# Altium footprint library WR-TBL_Pluggable PCB Header_5.08mm.PcbLib: 295 footprints (part 19 of 19)
Each footprint in its own frame and in the unit in brackets; x right, y up, seen from the top. Pads: shape width x height; smd on the part's side, far side on the other; paste and mask are expansions set on the pad; w line width, h text height; cw(c..) or ccw(c..) is an arc to the next point about the centre after c.
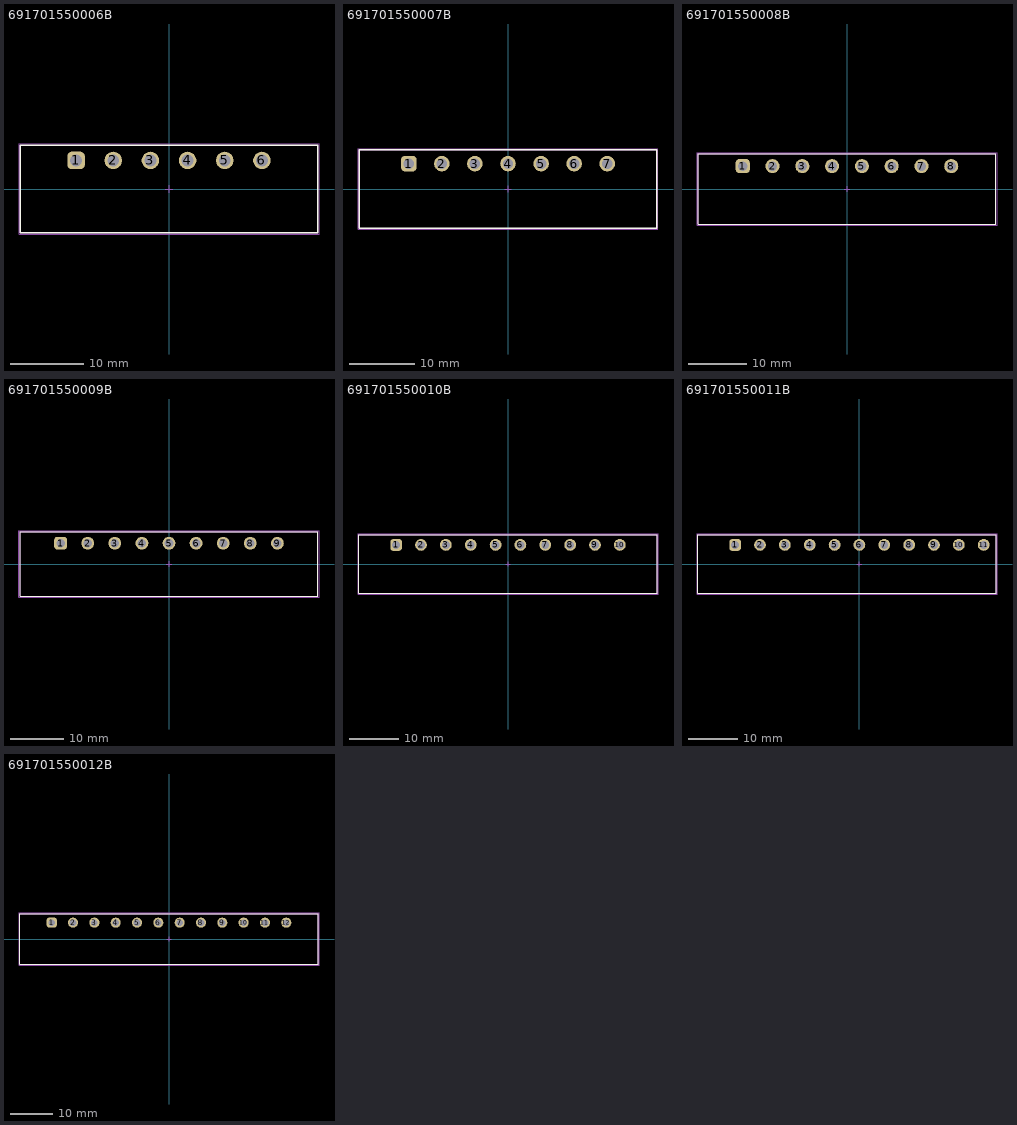
[diagram p18: the footprints below, top view; thin cyan lines are the x and y axes]

## 691701550006B [mm] "THR - 5,08mm - PCB Horizontal Flange - 06p"
height 8.4
pads (6):
  rrect50% 2.4x2.4 hole 1.6: 1(-12.7,3.9)
  round 2.4 hole 1.6: 2(-7.62,3.9) 3(-2.54,3.9) 4(2.54,3.9) 5(7.62,3.9) 6(12.7,3.9)
Top Overlay:
  lines w0.2: -20.3,-6 -20.3,6 20.3,6 20.3,-6 -20.3,-6
Top Designator:
  text ".Designator" at -7.498,-0.5 h1.5
Top Component Outline:
  lines w0.1: -20.3,-6 20.3,-6 20.3,6 -20.3,6 -20.3,-6
Top 3D Body:
  lines w0.1: -20.3,-6 -20.3,6 20.3,6 20.3,-6 -20.3,-6
Top Courtyard:
  lines w0.05: -0.5,0 0.5,0 ; 0,-0.5 0,0.5 ; -20.5,-6.2 -20.5,6.2 20.5,6.2 20.5,-6.2 -20.5,-6.2
3D body "691701550006B.stp": height 8.55, standoff -2.75, extent -20.32,-6 20.32,6

## 691701550007B [mm] "THR - 5,08mm - PCB Horizontal Flange - 07p"
height 8.4
pads (7):
  rrect50% 2.4x2.4 hole 1.6: 1(-15.24,3.9)
  round 2.4 hole 1.6: 2(-10.16,3.9) 3(-5.08,3.9) 4(0,3.9) 5(5.08,3.9) 6(10.16,3.9) 7(15.24,3.9)
Top Overlay:
  lines w0.2: -22.84,-6 22.84,-6 22.84,6 -22.84,6 -22.84,-6
Top Designator:
  text ".Designator" at -7.498,-0.5 h1.5
Top Component Outline:
  lines w0.1: -22.84,-6 -22.84,6 22.84,6 22.84,-6 -22.84,-6
Top 3D Body:
  lines w0.1: -22.84,-6 22.84,-6 22.84,6 -22.84,6 -22.84,-6
Top Courtyard:
  lines w0.05: -0.5,0 0.5,0 ; 0,-0.5 0,0.5 ; -23.04,-6.2 23.04,-6.2 23.04,6.2 -23.04,6.2 -23.04,-6.2
3D body "691701550007B.stp": height 8.55, standoff -2.75, extent -22.86,-6 22.86,6

## 691701550008B [mm] "THR - 5,08mm - PCB Horizontal Flange - 08p"
height 8.4
pads (8):
  rrect50% 2.4x2.4 hole 1.6: 1(-17.78,3.9)
  round 2.4 hole 1.6: 2(-12.7,3.9) 3(-7.62,3.9) 4(-2.54,3.9) 5(2.54,3.9) 6(7.62,3.9) 7(12.7,3.9) 8(17.78,3.9)
Top Overlay:
  lines w0.2: -25.38,-6 25.38,-6 25.38,6 -25.38,6 -25.38,-6
Top Designator:
  text ".Designator" at -7.498,-0.5 h1.5
Top Component Outline:
  lines w0.1: -25.38,-6 -25.38,6 25.38,6 25.38,-6 -25.38,-6
Top 3D Body:
  lines w0.1: -25.38,-6 25.38,-6 25.38,6 -25.38,6 -25.38,-6
Top Courtyard:
  lines w0.05: -0.5,0 0.5,0 ; 0,-0.5 0,0.5 ; -25.58,-6.2 25.58,-6.2 25.58,6.2 -25.58,6.2 -25.58,-6.2
3D body "691701550008B.stp": height 8.55, standoff -2.75, extent -25.4,-6 25.4,6

## 691701550009B [mm] "THR - 5,08mm - PCB Horizontal Flange - 09p"
height 8.4
pads (9):
  rrect50% 2.4x2.4 hole 1.6: 1(-20.32,3.9)
  round 2.4 hole 1.6: 2(-15.24,3.9) 3(-10.16,3.9) 4(-5.08,3.9) 5(0,3.9) 6(5.08,3.9) 7(10.16,3.9) 8(15.24,3.9) 9(20.32,3.9)
Top Overlay:
  lines w0.2: -27.92,-6 27.92,-6 27.92,6 -27.92,6 -27.92,-6
Top Designator:
  text ".Designator" at -7.498,-0.5 h1.5
Top Component Outline:
  lines w0.1: -27.92,-6 -27.92,6 27.92,6 27.92,-6 -27.92,-6
Top 3D Body:
  lines w0.1: -27.92,-6 27.92,-6 27.92,6 -27.92,6 -27.92,-6
Top Courtyard:
  lines w0.05: -0.5,0 0.5,0 ; 0,-0.5 0,0.5 ; -28.12,-6.2 28.12,-6.2 28.12,6.2 -28.12,6.2 -28.12,-6.2
3D body "691701550009B.stp": height 8.55, standoff -2.75, extent -27.94,-6 27.94,6

## 691701550010B [mm] "THR - 5,08mm - PCB Horizontal Flange - 10p"
height 8.4
pads (10):
  rrect50% 2.4x2.4 hole 1.6: 1(-22.86,3.9)
  round 2.4 hole 1.6: 2(-17.78,3.9) 3(-12.7,3.9) 4(-7.62,3.9) 5(-2.54,3.9) 6(2.54,3.9) 7(7.62,3.9) 8(12.7,3.9) 9(17.78,3.9) 10(22.86,3.9)
Top Overlay:
  lines w0.2: -30.46,-6 -30.46,6 30.46,6 30.46,-6 -30.46,-6
Top Designator:
  text ".Designator" at -7.498,-0.5 h1.5
Top Component Outline:
  lines w0.1: -30.46,-6 30.46,-6 30.46,6 -30.46,6 -30.46,-6
Top 3D Body:
  lines w0.1: -30.46,-6 -30.46,6 30.46,6 30.46,-6 -30.46,-6
Top Courtyard:
  lines w0.05: -0.5,0 0.5,0 ; 0,-0.5 0,0.5 ; -30.66,-6.2 -30.66,6.2 30.66,6.2 30.66,-6.2 -30.66,-6.2
3D body "691701550010B.stp": height 8.55, standoff -2.75, extent -30.48,-6 30.48,6

## 691701550011B [mm] "THR - 5,08mm - PCB Horizontal Flange - 11p"
height 8.4
pads (11):
  rrect50% 2.4x2.4 hole 1.6: 1(-25.4,3.9)
  round 2.4 hole 1.6: 2(-20.32,3.9) 3(-15.24,3.9) 4(-10.16,3.9) 5(-5.08,3.9) 6(0,3.9) 7(5.08,3.9) 8(10.16,3.9) 9(15.24,3.9) 10(20.32,3.9) 11(25.4,3.9)
Top Overlay:
  lines w0.2: -33,-6 -33,6 27.92,6 27.92,-6 -33,-6
Top Designator:
  text ".Designator" at -7.498,-0.5 h1.5
Top Component Outline:
  lines w0.1: -33,-6 27.92,-6 27.92,6 -33,6 -33,-6
Top 3D Body:
  lines w0.1: -33,-6 -33,6 27.92,6 27.92,-6 -33,-6
Top Courtyard:
  lines w0.05: -0.5,0 0.5,0 ; 0,-0.5 0,0.5 ; -33.2,-6.2 -33.2,6.2 28.12,6.2 28.12,-6.2 -33.2,-6.2
3D body "691701550010B.stp": height 8.55, standoff -2.75, extent -33.02,-6 27.94,6

## 691701550012B [mm] "THR - 5,08mm - PCB Horizontal Flange - 12p"
height 8.4
pads (12):
  rrect50% 2.4x2.4 hole 1.6: 1(-27.94,3.9)
  round 2.4 hole 1.6: 2(-22.86,3.9) 3(-17.78,3.9) 4(-12.7,3.9) 5(-7.62,3.9) 6(-2.54,3.9) 7(2.54,3.9) 8(7.62,3.9) 9(12.7,3.9) 10(17.78,3.9) 11(22.86,3.9) 12(27.94,3.9)
Top Overlay:
  lines w0.2: -35.54,-6 -35.54,6 35.54,6 35.54,-6 -35.54,-6
Top Designator:
  text ".Designator" at -7.498,-0.5 h1.5
Top Component Outline:
  lines w0.1: -35.54,-6 35.54,-6 35.54,6 -35.54,6 -35.54,-6
Top 3D Body:
  lines w0.1: -35.54,-6 -35.54,6 35.54,6 35.54,-6 -35.54,-6
Top Courtyard:
  lines w0.05: -0.5,0 0.5,0 ; 0,-0.5 0,0.5 ; -35.74,-6.2 -35.74,6.2 35.74,6.2 35.74,-6.2 -35.74,-6.2
3D body "691701550012B.stp": height 8.55, standoff -2.75, extent -35.56,-6 35.56,6